# Altium footprint library DIOT_temperature_logger.PcbLib: 100 footprints (part 4 of 7)
Each footprint in its own frame and in the unit in brackets; x right, y up, seen from the top. Pads: shape width x height; smd on the part's side, far side on the other; paste and mask are expansions set on the pad; w line width, h text height; cw(c..) or ccw(c..) is an arc to the next point about the centre after c.
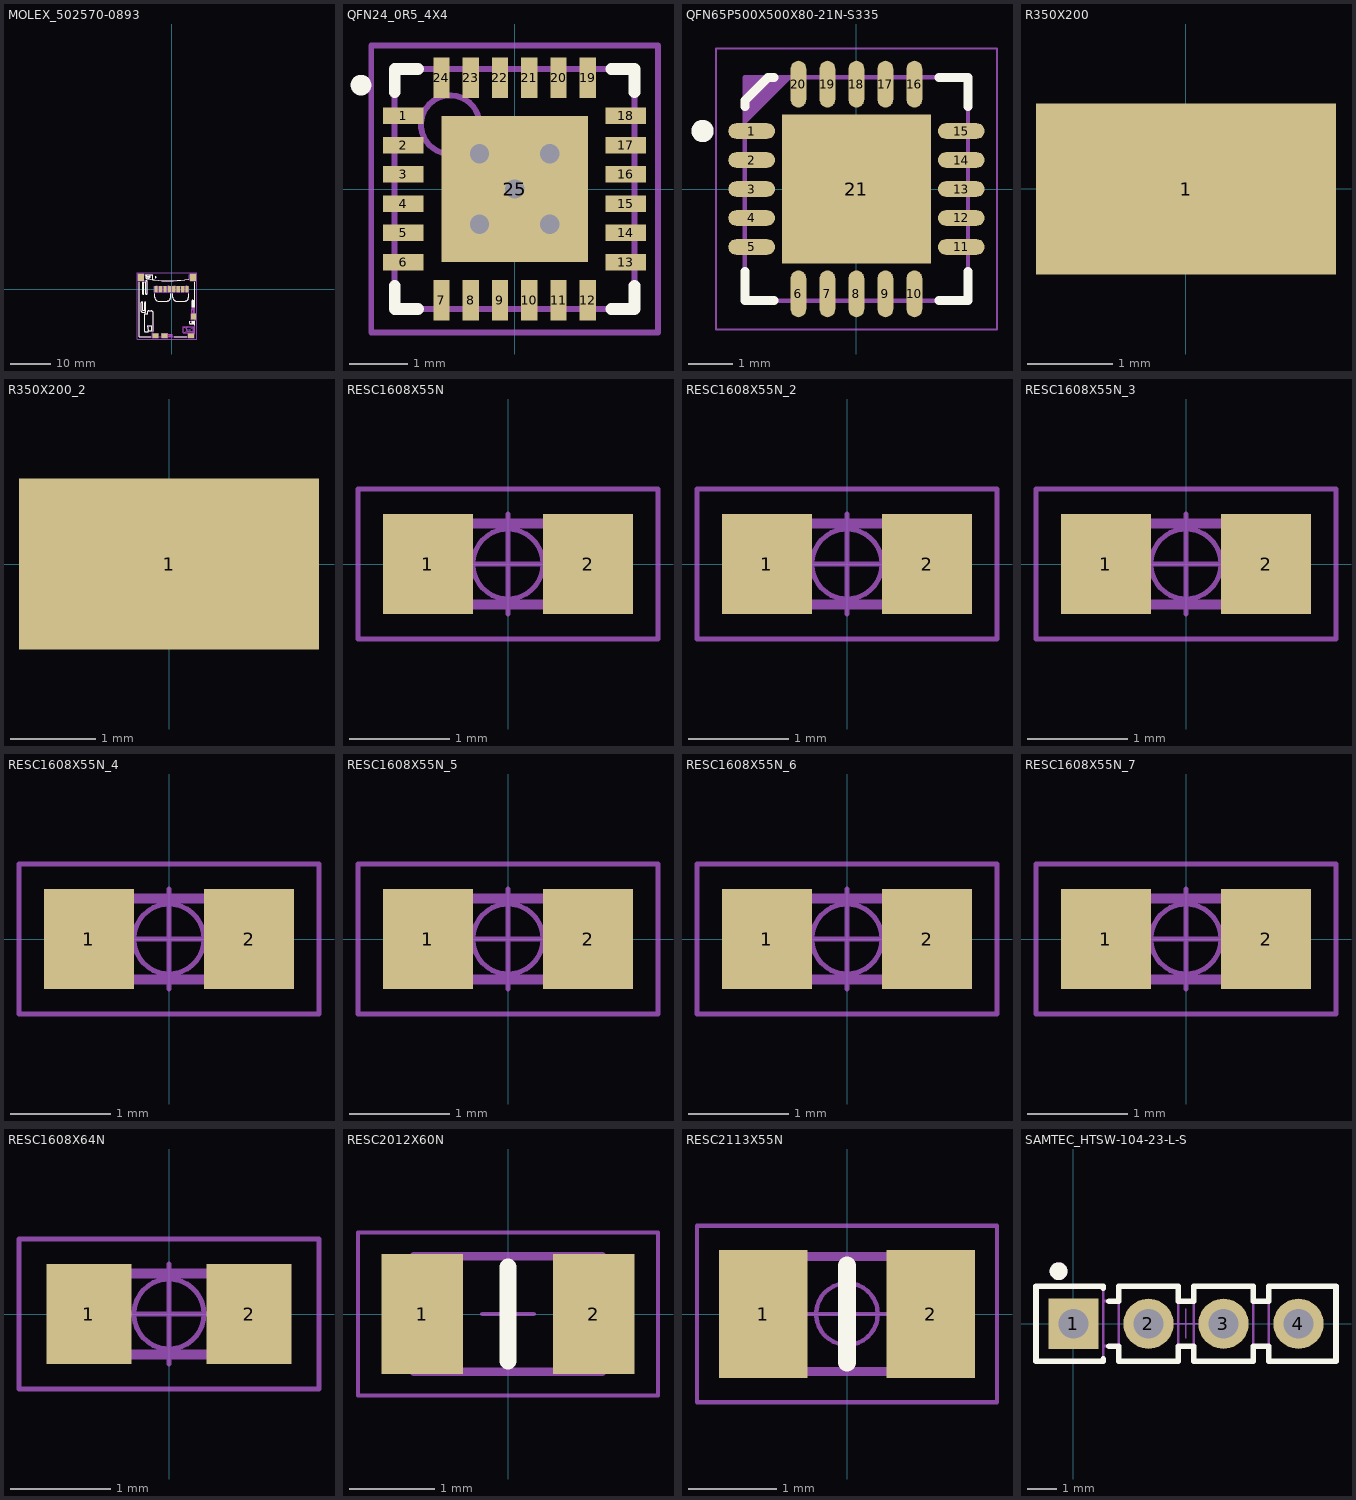
[diagram p3: the footprints below, top view; thin cyan lines are the x and y axes]

## MOLEX_502570-0893 [mm] "1.10mm Pitch, Surface Mount, Normal Mount MicroSD Memory Card Connector"
height 2.03
pads (14):
  rect 0.8x1.5 smd: 1(-3.85,0) 2(-2.75,0) 3(-1.65,0) 4(-0.55,0) 5(0.55,0) 6(1.65,0) 7(2.75,0) 8(3.85,0)
  rect 1.4x1.7 smd: 9(-7.6,2.9) 10(5.3,2.9)
  rect 1.5x1.15 smd: 11(-4.05,-11.575) 12(-1.75,-11.575) 13(4.85,-11.575)
  rect 1.15x1.5 smd: 14(5.425,-6.85)
Top Layer keep-out:
  lines w0.1: -0.8,-11.687 -0.8,-11.2 0.2,-11.2 0.2,-11.687 -0.8,-11.687 ; 2.85,-10.8 2.85,-9.4 5.75,-9.4 5.75,-10.8 2.85,-10.8 ; 5.05,-5.9 5.55,-5.9 5.55,-4.9 5.05,-4.9 5.05,-5.9
Top Overlay:
  circle w0.25: c-3.975,2.925 r0.125
  lines w0.2: -8.05,1.65 -8.05,-11.9 -5.2,-11.9 ; -7.2,1.65 -7.2,-1.2 ccw(c-7.1,-1.2) -7.1,-1.3 -7,-1.3 ccw(c-7,-1.2) -6.9,-1.2 -6.9,1.65 ; -6.5,1.7 -6.45,1.7 cw(c-6.45,1.65) -6.4,1.65 -6.4,-1.2 ccw(c-6.3,-1.2) -6.3,-1.3 -6.2,-1.3 ccw(c-6.2,-1.2) -6.1,-1.2 -6.1,1.85 ccw(c-6.25,1.85) -6.25,2 -6.5,2 ; -6.5,3.6 -4.69,3.6 -4.69,2.323 ; -6.24,3.25 -6.29,3.25 -6.29,3.6 -6.24,3.55 -6.24,2.658 ccw(c-6.14,2.658) -6.158,2.56 ccw(c-0.65,32.05) 4.2,2.445 ; -6.21,3.22 -5.36,3.22 ; -6.21,3.6 -6.21,3.07 -5.71,3.07 -5.61,2.97 -5.36,2.97 -5.36,3.6 ; -6.01,3.07 cw(c-6.01,2.87) -5.81,2.87 -5.81,2.497 ; -5.81,2.702 -5.661,2.577 cw(c-5.79,2.424) -5.593,2.46 ; -5.79,-10.4 -4.99,-10.4 ; -4.99,-10.5 -4.99,-9.169 -6.034,-9.169 -5.79,-10.291 -5.79,-10.5 cw(c-5.94,-10.5) -5.94,-10.65 -6.57,-10.65 cw(c-6.57,-10.5) -6.72,-10.5 -6.72,-6.25 cw(c-6.57,-6.25) -6.57,-6.1 -6.035,-6.1 ccw(c-6.035,-5.95) -5.885,-5.95 -5.885,-5.55 cw(c-5.735,-5.55) -5.735,-5.4 -5.09,-5.4 cw(c-5.09,-5.9) -4.59,-5.9 -4.59,-10.5 ; -4.69,2.35 -4.39,2.35 -4.39,2.284 ; -4.2,-1.15 -4.2,-2 ccw(c-3.2,-2) -3.2,-3 -1.25,-3 ccw(c-1.25,-2) -0.25,-2 -0.25,-1.15 ; 0.25,-1.15 0.25,-2 ccw(c1.25,-2) 1.25,-3 3.2,-3 ccw(c3.2,-2) 4.2,-2 4.2,-1.15 ; 0.6,-11.9 3.7,-11.9 ; 4.473,-8 ccw(c4.56,-8.05) 4.46,-8.05 4.46,-8.55 ccw(c4.56,-8.55) 4.56,-8.65 5.75,-8.65 ; 5.06,-8.648 5.06,-8 ; 5.18,-4.5 5.18,-2.85 cw(c5.28,-2.85) 5.28,-2.75 5.75,-2.75 ; 5.18,-3.53 5.6,-3.53 ; 5.18,-3.35 5.6,-3.35 ; 5.18,-3.2 5.6,-3.2 ; 5.18,-3.18 5.5,-3.18 ccw(c5.5,-2.93) 5.75,-2.93 ; 5.18,-3.03 5.5,-3.03 ccw(c5.5,-2.93) 5.6,-2.93 ; 5.18,-3.01 5.41,-3.01 5.6,-2.82 ; 5.18,-2.91 5.51,-2.91 ; 5.37,-4.5 5.37,-3.53 ; 5.37,-4.35 5.6,-4.35 ; 5.37,-3.75 5.6,-3.75 ; 5.41,-8.65 5.41,-8 ; 5.47,-4.5 5.47,-4.35 ; 5.47,-3.75 5.47,-3.53 ; 5.6,-8.641 5.6,-8 ; 5.6,-4.5 5.6,-2.75 ; 5.6,-3.4 5.75,-3.399 ; 5.75,-9 5.75,-8 ; 5.75,-4.5 5.75,1.65 ; -7.5,-5.55 ccw(c-7.35,-5.55) -7.35,-5.7 -6.55,-5.7 ccw(c-6.55,-5.55) -6.4,-5.55 -6.4,-3.4 ccw(c-6.5,-3.4) -6.5,-3.3 -6.6,-3.3 ccw(c-6.6,-3.4) -6.7,-3.4 -6.7,-5.25 cw(c-6.75,-5.25) -6.75,-5.3 -7.15,-5.3 cw(c-7.15,-5.25) -7.2,-5.25 -7.2,-3.4 ccw(c-7.3,-3.4) -7.3,-3.3 -7.4,-3.3 ccw(c-7.4,-3.4) -7.5,-3.4 -7.5,-5.55
Mechanical 8:
  lines w0.1: -8.1,2.9 -7.6,2.9 ; -7.6,2.4 -7.6,2.9 ; -7.6,3.4 -7.6,2.9 ; -7.1,2.9 -7.6,2.9 ; -4.55,-11.575 -4.05,-11.575 ; -4.35,0 -3.85,0 ; -4.05,-12.075 -4.05,-11.575 ; -4.05,-11.075 -4.05,-11.575 ; -3.85,-0.5 -3.85,0 ; -3.85,0.5 -3.85,0 ; -3.55,-11.575 -4.05,-11.575 ; -3.35,0 -3.85,0 ; -3.25,0 -2.75,0 ; -2.75,-0.5 -2.75,0 ; -2.75,0.5 -2.75,0 ; -2.25,-11.575 -1.75,-11.575 ; -2.25,0 -2.75,0 ; -2.15,0 -1.65,0 ; -1.75,-12.075 -1.75,-11.575 ; -1.75,-11.075 -1.75,-11.575 ; -1.65,-0.5 -1.65,0 ; -1.65,0.5 -1.65,0 ; -1.25,-11.575 -1.75,-11.575 ; -1.15,0 -1.65,0 ; -1.05,0 -0.55,0 ; -0.55,-0.5 -0.55,0 ; -0.55,0.5 -0.55,0 ; -0.354,-0.354 0,0 ; -0.354,0.354 0,0 ; -0.05,0 -0.55,0 ; 0.05,0 0.55,0 ; 0.354,-0.354 0,0 ; 0.354,0.354 0,0 ; 0.55,-0.5 0.55,0 ; 0.55,0.5 0.55,0 ; 1.05,0 0.55,0 ; 1.15,0 1.65,0 ; 1.65,-0.5 1.65,0 ; 1.65,0.5 1.65,0 ; 2.15,0 1.65,0 ; 2.25,0 2.75,0 ; 2.75,-0.5 2.75,0 ; 2.75,0.5 2.75,0 ; 3.25,0 2.75,0 ; 3.35,0 3.85,0 ; 3.85,-0.5 3.85,0 ; 3.85,0.5 3.85,0 ; 4.35,-11.575 4.85,-11.575 ; 4.35,0 3.85,0 ; 4.8,2.9 5.3,2.9 ; 4.85,-12.075 4.85,-11.575 ; 4.85,-11.075 4.85,-11.575 ; 4.925,-6.85 5.425,-6.85 ; 5.3,2.4 5.3,2.9 ; 5.3,3.4 5.3,2.9 ; 5.35,-11.575 4.85,-11.575 ; 5.425,-7.35 5.425,-6.85 ; 5.425,-6.35 5.425,-6.85 ; 5.8,2.9 5.3,2.9 ; 5.925,-6.85 5.425,-6.85 ; -0.8,-11.7 -0.3,-11.45 ; -0.8,-11.7 0.2,-11.7 ; -0.8,-11.7 -0.8,-11.2 ; -0.8,-11.2 -0.3,-11.45 ; -0.8,-11.2 0.2,-11.2 ; -0.3,-11.45 0.2,-11.7 ; -0.3,-11.45 0.2,-11.2 ; 0.2,-11.7 0.2,-11.2 ; 2.85,-10.8 4.3,-10.1 ; 2.85,-10.8 2.85,-9.4 ; 2.85,-10.8 5.75,-10.8 ; 2.85,-9.4 4.3,-10.1 ; 2.85,-9.4 5.75,-9.4 ; 4.3,-10.1 5.75,-10.8 ; 4.3,-10.1 5.75,-9.4 ; 5.05,-5.9 5.3,-5.4 ; 5.05,-5.9 5.55,-5.9 ; 5.05,-5.9 5.05,-4.9 ; 5.05,-4.9 5.3,-5.4 ; 5.05,-4.9 5.55,-4.9 ; 5.3,-5.4 5.55,-5.9 ; 5.3,-5.4 5.55,-4.9 ; 5.55,-5.9 5.55,-4.9 ; 5.75,-10.8 5.75,-9.4 ; -8.3,2.05 -8.3,3.75 -6.9,3.75 -6.9,2.05 -8.3,2.05 ; -4.8,-12.15 -4.8,-11 -3.3,-11 -3.3,-12.15 -4.8,-12.15 ; -4.25,-0.75 -4.25,0.75 -3.45,0.75 -3.45,-0.75 -4.25,-0.75 ; -3.15,-0.75 -3.15,0.75 -2.35,0.75 -2.35,-0.75 -3.15,-0.75 ; -2.5,-12.15 -1,-12.15 -1,-11 -2.5,-11 -2.5,-12.15 ; -2.05,-0.75 -2.05,0.75 -1.25,0.75 -1.25,-0.75 -2.05,-0.75 ; -0.95,-0.75 -0.95,0.75 -0.15,0.75 -0.15,-0.75 -0.95,-0.75 ; 0.15,-0.75 0.15,0.75 0.95,0.75 0.95,-0.75 0.15,-0.75 ; 1.25,-0.75 1.25,0.75 2.05,0.75 2.05,-0.75 1.25,-0.75 ; 2.35,-0.75 2.35,0.75 3.15,0.75 3.15,-0.75 2.35,-0.75 ; 3.45,-0.75 3.45,0.75 4.25,0.75 4.25,-0.75 3.45,-0.75 ; 4.1,-12.15 5.6,-12.15 5.6,-11 4.1,-11 4.1,-12.15 ; 4.6,2.05 4.6,3.75 6,3.75 6,2.05 4.6,2.05 ; 4.85,-7.6 4.85,-6.1 6,-6.1 6,-7.6 4.85,-7.6
Mechanical 14:
  drawing of 210 lines, arcs and shapes, not listed
Mechanical 15:
  lines w0.05: -8.55,-12.4 -8.55,4 6.25,4 6.25,-12.4 -8.55,-12.4
3D body "MOLEX_502570-0893.stp": height 1.8, standoff 0, extent -8.05,-11.9 5.75,3.6

## QFN24_0R5_4X4 [mm] "SQFN 24 Pins, Pitch 0.5mm, 4mmx4mm"
height 1
pads (25):
  rect 0.69x0.28 smd: 1(-1.9,1.25) 2(-1.9,0.75) 3(-1.9,0.25) 4(-1.9,-0.25) 5(-1.9,-0.75) 6(-1.9,-1.25) 13(1.9,-1.25) 14(1.9,-0.75) 15(1.9,-0.25) 16(1.9,0.25) 17(1.9,0.75) 18(1.9,1.25)
  rect 0.28x0.69 smd: 7(-1.25,-1.9) 8(-0.75,-1.9) 9(-0.25,-1.9) 10(0.25,-1.9) 11(0.75,-1.9) 12(1.25,-1.9) 19(1.25,1.9) 20(0.75,1.9) 21(0.25,1.9) 22(-0.25,1.9) 23(-0.75,1.9) 24(-1.25,1.9)
  rect 2.5x2.5 smd: 25(0,0)
via -0.6,0.6 diameter 0.66 hole 0.33
via 0.6,0.6 diameter 0.66 hole 0.33
via -0.6,-0.6 diameter 0.66 hole 0.33
via 0.6,-0.6 diameter 0.66 hole 0.33
via 0,0 diameter 0.66 hole 0.33
Top Overlay:
  circle w0.25: c-2.625,1.775 r0.051
  lines w0.2: -2.05,-1.651 -2.05,-2.05 -1.651,-2.05 ; -2.05,1.651 -2.05,2.05 -1.651,2.05 ; 1.651,-2.05 2.05,-2.05 2.05,-1.651 ; 1.651,2.05 2.05,2.05 2.05,1.651
Mechanical 13:
  circle w0.1: c-1.1,1.1 r0.5
  lines w0.1: -2.05,-2.05 -2.05,2.05 2.05,2.05 2.05,-2.05 -2.05,-2.05
Mechanical 15:
  lines w0.1: -0.5,0 0.5,0 ; 0,-0.5 0,0.5 ; -2.45,-2.45 -2.45,2.45 2.45,2.45 2.45,-2.45 -2.45,-2.45
3D body: height 1, standoff 0.02, extent -2.05,-2.05 2.05,2.05

## QFN65P500X500X80-21N-S335 [mm] "QFN, 0.65mm pitch,square; 20 pin, 5mm X 5mm X 0.8mm H body (w/thermal tab 3.35 X 3.35mm),  IPC Medium Density"
height 0.8
pads (21):
  oval 1.05x0.35 smd: 1(-2.35,1.3) 2(-2.35,0.65) 3(-2.35,0) 4(-2.35,-0.65) 5(-2.35,-1.3) 11(2.35,-1.3) 12(2.35,-0.65) 13(2.35,0) 14(2.35,0.65) 15(2.35,1.3)
  oval 0.35x1.05 smd: 6(-1.3,-2.35) 7(-0.65,-2.35) 8(0,-2.35) 9(0.65,-2.35) 10(1.3,-2.35) 16(1.3,2.35) 17(0.65,2.35) 18(0,2.35) 19(-0.65,2.35) 20(-1.3,2.35)
  rect 3.35x3.35 smd: 21(0,0)
Top Overlay:
  circle w0.25: c-3.45,1.3 r0.125
  lines w0.2: -2.5,-1.85 -2.5,-2.5 -1.85,-2.5 ; -2.5,1.85 -2.5,1.98 -1.98,2.5 -1.85,2.5 ; 1.85,-2.5 2.5,-2.5 2.5,-1.85 ; 1.85,2.5 2.5,2.5 2.5,1.85
Mechanical 14:
  lines w0.1: -2.5,1.5 -1.5,2.5 ; -2.5,1.6 -1.6,2.5 ; -2.5,1.7 -1.7,2.5 ; -2.5,1.8 -1.8,2.5 ; -2.5,1.9 -1.9,2.5 ; -2.5,2 -2,2.5 ; -2.5,2.1 -2.1,2.5 ; -2.5,2.2 -2.2,2.5 ; -2.5,2.3 -2.3,2.5 ; -2.5,2.4 -2.4,2.5 ; -2.5,-2.5 -2.5,2.5 2.5,2.5 2.5,-2.5 -2.5,-2.5
Mechanical 15:
  lines w0.05: -0.5,0 0.5,0 ; 0,-0.5 0,0.5 ; -3.15,-3.15 -3.15,3.15 3.15,3.15 3.15,-3.15 -3.15,-3.15
3D body "QFN65P500X500X100-21N-S325.stp": height 1, standoff 0, extent -2.575,-2.575 2.575,2.575

## R350X200 [mm] "3.5mm x  2mm SMD Pad"
height 7.01
pads (1):
  rect 3.5x2 smd paste-1: 1(0,0)

## R350X200_2 [mm]
pads (1):
  rect 3.5x2 smd paste-1: 1(0,0)

## RESC1608X55N [mm] "Chip Resistor, EIA 0603, Metric 1608, Body 1.6x0.8mm, IPC Medium Density"
height 0.55
pads (2):
  rect 0.9x1 smd: 1(-0.8,0) 2(0.8,0)
Mechanical 14:
  lines w0.1: -0.8,-0.405 -0.8,0.405 0.8,0.405 0.8,-0.405 -0.8,-0.405
Mechanical 15:
  circle w0.05: c0,0 r0.35
  lines w0.05: -0.5,0 0.5,0 ; 0,-0.5 0,0.5 ; -1.5,-0.75 1.5,-0.75 1.5,0.75 -1.5,0.75 -1.5,-0.75
3D body "RESC1608X55N.stp": height 0.55, standoff 0, extent -0.875,-0.475 0.875,0.475

## RESC1608X55N_2 [mm]
pads (2):
  rect 0.9x1 smd: 1(-0.8,0) 2(0.8,0)
Mechanical 14:
  lines w0.1: -0.8,-0.405 0.8,-0.405 0.8,0.405 -0.8,0.405 -0.8,-0.405
Mechanical 15:
  circle w0.05: c0,0 r0.35
  lines w0.05: -0.5,0 0.5,0 ; 0,-0.5 0,0.5 ; -1.5,-0.75 -1.5,0.75 1.5,0.75 1.5,-0.75 -1.5,-0.75
3D body "RESC1608X55N.stp": height 0.55, standoff 0, extent -0.875,-0.475 0.875,0.475

## RESC1608X55N_3 [mm]
pads (2):
  rect 0.9x1 smd: 1(-0.8,0) 2(0.8,0)
Mechanical 14:
  lines w0.1: -0.8,-0.405 -0.8,0.405 0.8,0.405 0.8,-0.405 -0.8,-0.405
Mechanical 15:
  circle w0.05: c0,0 r0.35
  lines w0.05: -0.5,0 0.5,0 ; 0,-0.5 0,0.5 ; -1.5,-0.75 1.5,-0.75 1.5,0.75 -1.5,0.75 -1.5,-0.75
3D body "RESC1608X55N.stp": height 0.55, standoff 0, extent -0.875,-0.475 0.875,0.475

## RESC1608X55N_4 [mm]
pads (2):
  rect 0.9x1 smd: 1(-0.8,0) 2(0.8,0)
Mechanical 14:
  lines w0.1: -0.8,-0.405 0.8,-0.405 0.8,0.405 -0.8,0.405 -0.8,-0.405
Mechanical 15:
  circle w0.05: c0,0 r0.35
  lines w0.05: -0.5,0 0.5,0 ; 0,-0.5 0,0.5 ; -1.5,-0.75 1.5,-0.75 1.5,0.75 -1.5,0.75 -1.5,-0.75
3D body "RESC1608X55N.stp": height 0.55, standoff 0, extent -0.875,-0.475 0.875,0.475

## RESC1608X55N_5 [mm]
pads (2):
  rect 0.9x1 smd: 1(-0.8,0) 2(0.8,0)
Mechanical 14:
  lines w0.1: -0.8,-0.405 0.8,-0.405 0.8,0.405 -0.8,0.405 -0.8,-0.405
Mechanical 15:
  circle w0.05: c0,0 r0.35
  lines w0.05: -0.5,0 0.5,0 ; 0,-0.5 0,0.5 ; -1.5,-0.75 1.5,-0.75 1.5,0.75 -1.5,0.75 -1.5,-0.75
3D body "RESC1608X55N.stp": height 0.55, standoff 0, extent -0.875,-0.475 0.875,0.475

## RESC1608X55N_6 [mm]
pads (2):
  rect 0.9x1 smd: 1(-0.8,0) 2(0.8,0)
Mechanical 14:
  lines w0.1: -0.8,-0.405 -0.8,0.405 0.8,0.405 0.8,-0.405 -0.8,-0.405
Mechanical 15:
  circle w0.05: c0,0 r0.35
  lines w0.05: -0.5,0 0.5,0 ; 0,-0.5 0,0.5 ; -1.5,-0.75 1.5,-0.75 1.5,0.75 -1.5,0.75 -1.5,-0.75
3D body "RESC1608X55N.stp": height 0.55, standoff 0, extent -0.875,-0.475 0.875,0.475

## RESC1608X55N_7 [mm]
pads (2):
  rect 0.9x1 smd: 1(-0.8,0) 2(0.8,0)
Mechanical 14:
  lines w0.1: -0.8,-0.405 0.8,-0.405 0.8,0.405 -0.8,0.405 -0.8,-0.405
Mechanical 15:
  circle w0.05: c0,0 r0.35
  lines w0.05: -0.5,0 0.5,0 ; 0,-0.5 0,0.5 ; -1.5,-0.75 1.5,-0.75 1.5,0.75 -1.5,0.75 -1.5,-0.75
3D body "RESC1608X55N.stp": height 0.55, standoff 0, extent -0.875,-0.475 0.875,0.475

## RESC1608X64N [mm] "Chip Resistor, EIA 0603, Metric 1608, Body 1.6x0.8mm, IPC Medium Density"
height 0.64
pads (2):
  rect 0.85x1 smd: 1(-0.8,0) 2(0.8,0)
Mechanical 14:
  lines w0.1: -0.8,-0.405 0.8,-0.405 0.8,0.405 -0.8,0.405 -0.8,-0.405
Mechanical 15:
  circle w0.05: c0,0 r0.35
  lines w0.05: -0.5,0 0.5,0 ; 0,-0.5 0,0.5 ; -1.5,-0.75 1.5,-0.75 1.5,0.75 -1.5,0.75 -1.5,-0.75
3D body "RESC1608X64N.stp": height 0.64, standoff 0, extent -0.875,-0.475 0.875,0.475

## RESC2012X60N [mm] "Chip Resistor, EIA 0805, Metric 2012, Body 2.0x1.2mm, IPC Medium Density"
height 0.6
pads (2):
  rect 0.95x1.4 smd: 1(-1,0) 2(1,0)
Top Overlay:
  lines w0.2: 0,-0.55 0,0.55
Mechanical 14:
  lines w0.1: -1.1,0.675 -1.1,-0.675 1.1,-0.675 1.1,0.675 ; -1.1,0.675 1.1,0.675
Mechanical 15:
  lines w0.05: -0.3,0 0.3,0 ; 0,-0.3 0,0.3 ; -1.75,-0.95 -1.75,0.95 1.75,0.95 1.75,-0.95 -1.75,-0.95
3D body "RESC2012X60N.stp": height 0.6, standoff 0, extent -1.1,-0.675 1.1,0.675

## RESC2113X55N [mm] "Chip Resistor, EIA 0805, Metric 2113, Body 2.05x1.3mm, IPC Medium Density"
height 0.55
pads (2):
  rect 1x1.45 smd: 1(-0.95,0) 2(0.95,0)
Top Overlay:
  lines w0.2: 0,-0.55 0,0.55
Mechanical 14:
  lines w0.1: -1.025,-0.65 1.025,-0.65 1.025,0.65 -1.025,0.65 -1.025,-0.65
Mechanical 15:
  circle w0.05: c0,0 r0.35
  lines w0.05: -0.5,0 0.5,0 ; 0,-0.5 0,0.5 ; -1.7,-1 1.7,-1 1.7,1 -1.7,1 -1.7,-1
3D body "RESC2113X55N.stp": height 0.55, standoff 0, extent -1,-0.625 1,0.625

## SAMTEC_HTSW-104-23-L-S [mm] "4 Contacts - Pitch 2.54mm - Single Row Through Mount Straigh Header (Post Lead 5.84mm, Tail Lead 2.92mm, Insulator 2.54mm)"
height 8.38
pads (4):
  rect 1.7x1.7 hole 1: 1(0,0)
  round 1.7 hole 1: 2(2.54,0) 3(5.08,0) 4(7.62,0)
Top Overlay:
  circle w0.3: c-0.508,1.778 r0.15
  lines w0.2: 1.007,-1.2 1.007,-1.27 -1.27,-1.27 -1.27,1.27 1.007,1.27 1.007,1.2 ; 1.2,-0.762 1.533,-0.762 1.533,-1.27 3.547,-1.27 3.547,-0.762 4.073,-0.762 4.073,-1.27 6.087,-1.27 6.087,-0.762 6.613,-0.762 6.613,-1.27 8.89,-1.27 8.89,1.27 6.613,1.27 6.613,0.762 6.087,0.762 6.087,1.27 4.073,1.27 4.073,0.762 3.547,0.762 3.547,1.27 1.533,1.27 1.533,0.762 1.2,0.762
Mechanical 8:
  lines w0.05: 3.31,0 3.81,0 ; 3.81,-0.5 3.81,0 ; 3.81,0.5 3.81,0 ; 4.31,0 3.81,0
  lines w0.1: -0.5,0 0,0 ; 0,-0.5 0,0 ; 0,0.5 0,0 ; 0.5,0 0,0 ; 2.04,0 2.54,0 ; 2.54,-0.5 2.54,0 ; 2.54,0.5 2.54,0 ; 3.04,0 2.54,0 ; 4.58,0 5.08,0 ; 5.08,-0.5 5.08,0 ; 5.08,0.5 5.08,0 ; 5.58,0 5.08,0 ; 7.12,0 7.62,0 ; 7.62,-0.5 7.62,0 ; 7.62,0.5 7.62,0 ; 8.12,0 7.62,0
Mechanical 14:
  circle w0.3: c-0.508,1.778 r0.15
  lines w0.1: 1.007,-0.762 1.533,-0.762 ; 1.007,0.762 1.533,0.762 ; 3.547,-0.762 4.073,-0.762 ; 3.547,0.762 4.073,0.762 ; 6.087,-0.762 6.613,-0.762 ; 6.087,0.762 6.613,0.762 ; -1.27,-1.27 -1.27,1.27 1.007,1.27 1.007,-1.27 -1.27,-1.27 ; -0.317,-0.318 -0.318,0.317 0.317,0.317 0.318,-0.317 -0.317,-0.318 ; 1.533,-1.27 3.547,-1.27 3.547,1.27 1.533,1.27 1.533,-1.27 ; 2.223,-0.318 2.222,0.317 2.857,0.317 2.858,-0.317 2.223,-0.318 ; 4.073,-1.27 4.073,1.27 6.087,1.27 6.087,-1.27 4.073,-1.27 ; 4.763,-0.318 4.763,0.317 5.397,0.317 5.398,-0.317 4.763,-0.318 ; 6.613,-1.27 6.613,1.27 8.89,1.27 8.89,-1.27 6.613,-1.27 ; 7.303,-0.318 7.303,0.317 7.938,0.317 7.938,-0.318 7.303,-0.318
3D body "SAMTEC_TSW-104-23-L-S.stp": height 8.38, standoff -2.92, extent -1.27,-1.27 8.89,1.27